# Altium footprint library ref-packages.PCBLIB: 1544 footprints (part 43 of 103)
Each footprint in its own frame and in the unit in brackets; x right, y up, seen from the top. Pads: shape width x height; smd on the part's side, far side on the other; paste and mask are expansions set on the pad; w line width, h text height; cw(c..) or ccw(c..) is an arc to the next point about the centre after c.
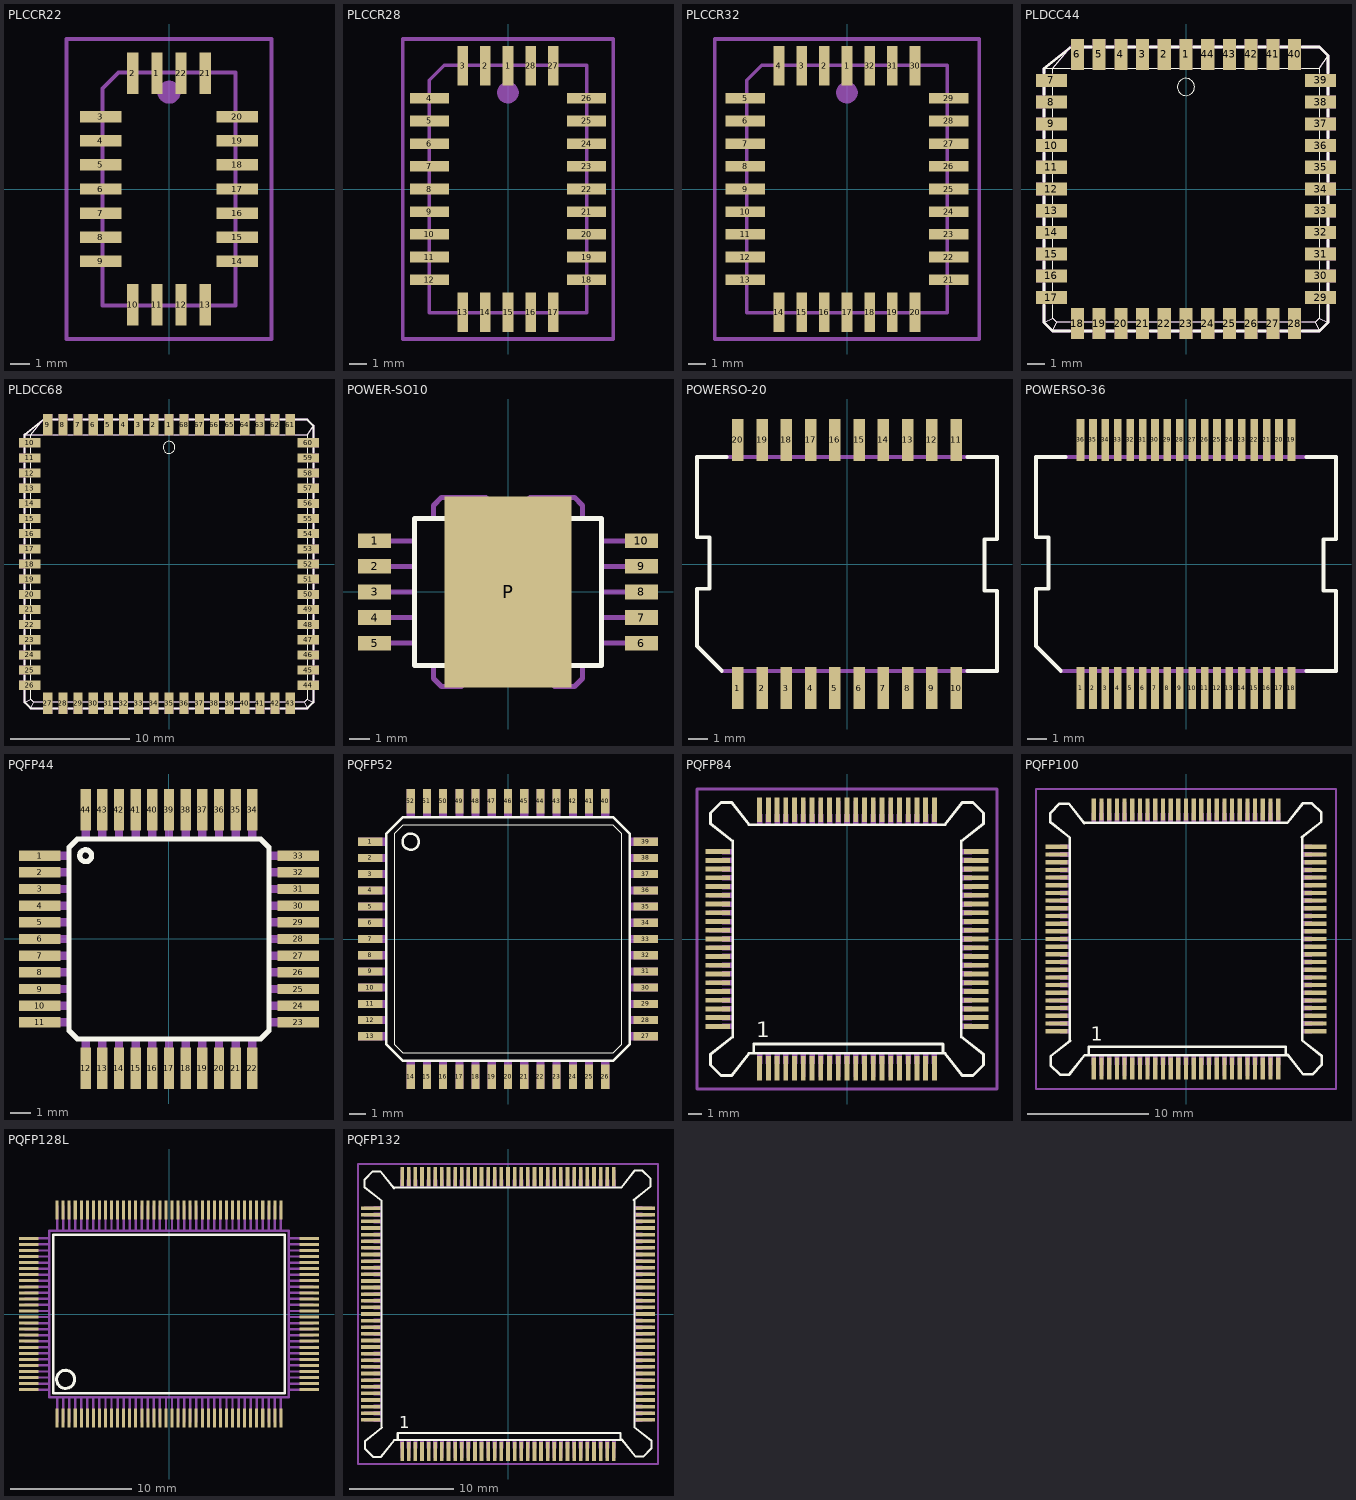
[diagram p42: the footprints below, top view; thin cyan lines are the x and y axes]

## PLCCR22 [mil]
pads (22):
  rect 23.62x86.61 smd: 1(-25,240.16) 2(-75,240.16) 10(-75,-240.16) 11(-25,-240.16) 12(25,-240.16) 13(75,-240.16) 21(75,240.16) 22(25,240.16)
  rect 86.61x23.62 smd: 3(-141.73,150) 4(-141.73,100) 5(-141.73,50) 6(-141.73,0) 7(-141.73,-50) 8(-141.73,-100) 9(-141.73,-150) 14(141.73,-150) 15(141.73,-100) 16(141.73,-50) 17(141.73,0) 18(141.73,50) 19(141.73,100) 20(141.73,150)
Mechanical 16:
  circle w24: c0,200.79 r11.81
  rectangle: -35.24,242.13 -14.37,264.96
  rectangle: -85.24,242.13 -64.37,264.96
  rectangle: -166.54,139.76 -143.7,160.63
  rectangle: -166.54,89.76 -143.7,110.63
  rectangle: -166.54,39.76 -143.7,60.63
  rectangle: -166.54,-10.24 -143.7,10.63
  rectangle: -166.54,-60.24 -143.7,-39.37
  rectangle: -166.54,-110.24 -143.7,-89.37
  rectangle: -166.54,-160.24 -143.7,-139.37
  rectangle: -85.63,-264.96 -64.76,-242.13
  rectangle: -35.63,-264.96 -14.76,-242.13
  rectangle: 14.37,-264.96 35.24,-242.13
  rectangle: 64.37,-264.96 85.24,-242.13
  rectangle: 143.7,-160.63 166.54,-139.76
  rectangle: 143.7,-110.63 166.54,-89.76
  rectangle: 143.7,-60.63 166.54,-39.76
  rectangle: 143.7,-10.63 166.54,10.24
  rectangle: 143.7,39.37 166.54,60.24
  rectangle: 143.7,89.37 166.54,110.24
  rectangle: 143.7,139.37 166.54,160.24
  rectangle: 64.76,242.13 85.63,264.96
  rectangle: 14.76,242.13 35.63,264.96
  lines w8: -138.19,-241.34 138.19,-241.34 138.19,241.34 -105.12,241.34 -138.19,208.27 -138.19,-241.34
Mechanical 27:
  lines w7.87: -212.72,-311.14 212.72,-311.14 212.72,311.14 -212.72,311.14 -212.72,-311.14

## PLCCR28 [mil]
pads (28):
  rect 23.62x86.61 smd: 1(0,271.65) 2(-50,271.65) 3(-100,271.65) 13(-100,-271.65) 14(-50,-271.65) 15(0,-271.65) 16(50,-271.65) 17(100,-271.65) 27(100,271.65) 28(50,271.65)
  rect 86.61x23.62 smd: 4(-173.23,200) 5(-173.23,150) 6(-173.23,100) 7(-173.23,50) 8(-173.23,0) 9(-173.23,-50) 10(-173.23,-100) 11(-173.23,-150) 12(-173.23,-200) 18(173.23,-200) 19(173.23,-150) 20(173.23,-100) 21(173.23,-50) 22(173.23,0) 23(173.23,50) 24(173.23,100) 25(173.23,150) 26(173.23,200)
Mechanical 16:
  circle w24: c0,212.6 r11.81
  rectangle: -10.24,273.62 10.63,296.46
  rectangle: -60.24,273.62 -39.37,296.46
  rectangle: -110.24,273.62 -89.37,296.46
  rectangle: -198.03,189.76 -175.2,210.63
  rectangle: -198.03,139.76 -175.2,160.63
  rectangle: -198.03,89.76 -175.2,110.63
  rectangle: -198.03,39.76 -175.2,60.63
  rectangle: -198.03,-10.24 -175.2,10.63
  rectangle: -198.03,-60.24 -175.2,-39.37
  rectangle: -198.03,-110.24 -175.2,-89.37
  rectangle: -198.03,-160.24 -175.2,-139.37
  rectangle: -198.03,-210.24 -175.2,-189.37
  rectangle: -110.63,-296.46 -89.76,-273.62
  rectangle: -60.63,-296.46 -39.76,-273.62
  rectangle: -10.63,-296.46 10.24,-273.62
  rectangle: 39.37,-296.46 60.24,-273.62
  rectangle: 89.37,-296.46 110.24,-273.62
  rectangle: 175.2,-210.63 198.03,-189.76
  rectangle: 175.2,-160.63 198.03,-139.76
  rectangle: 175.2,-110.63 198.03,-89.76
  rectangle: 175.2,-60.63 198.03,-39.76
  rectangle: 175.2,-10.63 198.03,10.24
  rectangle: 175.2,39.37 198.03,60.24
  rectangle: 175.2,89.37 198.03,110.24
  rectangle: 175.2,139.37 198.03,160.24
  rectangle: 175.2,189.37 198.03,210.24
  rectangle: 89.76,273.62 110.63,296.46
  rectangle: 39.76,273.62 60.63,296.46
  lines w8: -173.62,-272.83 173.62,-272.83 173.62,272.83 -140.55,272.83 -173.62,239.76 -173.62,-272.83
Mechanical 27:
  lines w7.87: -232.4,-330.83 232.4,-330.83 232.4,330.83 -232.4,330.83 -232.4,-330.83

## PLCCR32 [mm]
pads (32):
  rect 0.6x2.2 smd: 1(0,6.9) 2(-1.27,6.9) 3(-2.54,6.9) 4(-3.81,6.9) 14(-3.81,-6.9) 15(-2.54,-6.9) 16(-1.27,-6.9) 17(0,-6.9) 18(1.27,-6.9) 19(2.54,-6.9) 20(3.81,-6.9) 30(3.81,6.9) 31(2.54,6.9) 32(1.27,6.9)
  rect 2.2x0.6 smd: 5(-5.7,5.08) 6(-5.7,3.81) 7(-5.7,2.54) 8(-5.7,1.27) 9(-5.7,0) 10(-5.7,-1.27) 11(-5.7,-2.54) 12(-5.7,-3.81) 13(-5.7,-5.08) 21(5.7,-5.08) 22(5.7,-3.81) 23(5.7,-2.54) 24(5.7,-1.27) 25(5.7,0) 26(5.7,1.27) 27(5.7,2.54) 28(5.7,3.81) 29(5.7,5.08)
Mechanical 16:
  circle w0.61: c0,5.4 r0.3
  rectangle: -0.26,6.95 0.27,7.53
  rectangle: -1.53,6.95 -1,7.53
  rectangle: -2.8,6.95 -2.27,7.53
  rectangle: -4.07,6.95 -3.54,7.53
  rectangle: -6.33,4.82 -5.75,5.35
  rectangle: -6.33,3.55 -5.75,4.08
  rectangle: -6.33,2.28 -5.75,2.81
  rectangle: -6.33,1.01 -5.75,1.54
  rectangle: -6.33,-0.26 -5.75,0.27
  rectangle: -6.33,-1.53 -5.75,-1
  rectangle: -6.33,-2.8 -5.75,-2.27
  rectangle: -6.33,-4.07 -5.75,-3.54
  rectangle: -6.33,-5.34 -5.75,-4.81
  rectangle: -4.08,-7.53 -3.55,-6.95
  rectangle: -2.81,-7.53 -2.28,-6.95
  rectangle: -1.54,-7.53 -1.01,-6.95
  rectangle: -0.27,-7.53 0.26,-6.95
  rectangle: 1,-7.53 1.53,-6.95
  rectangle: 2.27,-7.53 2.8,-6.95
  rectangle: 3.54,-7.53 4.07,-6.95
  rectangle: 5.75,-5.35 6.33,-4.82
  rectangle: 5.75,-4.08 6.33,-3.55
  rectangle: 5.75,-2.81 6.33,-2.28
  rectangle: 5.75,-1.54 6.33,-1.01
  rectangle: 5.75,-0.27 6.33,0.26
  rectangle: 5.75,1 6.33,1.53
  rectangle: 5.75,2.27 6.33,2.8
  rectangle: 5.75,3.54 6.33,4.07
  rectangle: 5.75,4.81 6.33,5.34
  rectangle: 3.55,6.95 4.08,7.53
  rectangle: 2.28,6.95 2.81,7.53
  rectangle: 1.01,6.95 1.54,7.53
  lines w0.203: -5.61,-6.93 5.61,-6.93 5.61,6.93 -4.77,6.93 -5.61,6.09 -5.61,-6.93
Mechanical 27:
  lines w0.2: -7.403,-8.403 7.403,-8.403 7.403,8.403 -7.403,8.403 -7.403,-8.403

## PLDCC44 [mil]
pads (44):
  rect 29.92x70.87 smd: 1(0,309.45) 2(-50,309.45) 3(-100,309.45) 4(-150,309.45) 5(-200,309.45) 6(-250,309.45) 18(-250,-309.45) 19(-200,-309.45) 20(-150,-309.45) 21(-100,-309.45) 22(-50,-309.45) 23(0,-309.45) 24(50,-309.45) 25(100,-309.45) 26(150,-309.45) 27(200,-309.45) 28(250,-309.45) 40(250,309.45) 41(200,309.45) 42(150,309.45) 43(100,309.45) 44(50,309.45)
  rect 70.87x29.92 smd: 7(-309.45,250) 8(-309.45,200) 9(-309.45,150) 10(-309.45,100) 11(-309.45,50) 12(-309.45,0) 13(-309.45,-50) 14(-309.45,-100) 15(-309.45,-150) 16(-309.45,-200) 17(-309.45,-250) 29(309.45,-250) 30(309.45,-200) 31(309.45,-150) 32(309.45,-100) 33(309.45,-50) 34(309.45,0) 35(309.45,50) 36(309.45,100) 37(309.45,150) 38(309.45,200) 39(309.45,250)
Top Overlay:
  circle w2: c0,234.65 r19.69
  lines w2: -326.38,-306.69 -306.69,-296.85 ; -326.38,277.17 -306.69,277.17 ; -306.69,-326.38 -296.85,-306.69 ; -306.69,-265.75 -306.69,-296.85 ; -306.69,-234.25 -306.69,-215.75 ; -306.69,-184.25 -306.69,-165.75 ; -306.69,-134.25 -306.69,-115.75 ; -306.69,-84.25 -306.69,-65.75 ; -306.69,-34.25 -306.69,-15.75 ; -306.69,15.75 -306.69,34.25 ; -306.69,65.75 -306.69,84.25 ; -306.69,115.75 -306.69,134.25 ; -306.69,165.75 -306.69,184.25 ; -306.69,215.75 -306.69,234.25 ; -306.69,265.75 -306.69,277.17 ; -265.75,-306.69 -296.85,-306.69 ; -265.75,277.17 -306.69,277.17 ; -265.75,325.59 -306.69,277.17 ; -234.25,-306.69 -215.75,-306.69 ; -234.25,277.17 -215.75,277.17 ; -184.25,-306.69 -165.75,-306.69 ; -184.25,277.17 -165.75,277.17 ; -134.25,-306.69 -115.75,-306.69 ; -134.25,277.17 -115.75,277.17 ; -84.25,-306.69 -65.75,-306.69 ; -84.25,277.17 -65.75,277.17 ; -34.25,-306.69 -15.75,-306.69 ; -34.25,277.17 -15.75,277.17 ; 15.75,-306.69 34.25,-306.69 ; 15.75,277.17 34.25,277.17 ; 65.75,-306.69 84.25,-306.69 ; 65.75,277.17 84.25,277.17 ; 115.75,-306.69 134.25,-306.69 ; 115.75,277.17 134.25,277.17 ; 165.75,-306.69 184.25,-306.69 ; 165.75,277.17 184.25,277.17 ; 215.75,-306.69 234.25,-306.69 ; 215.75,277.17 234.25,277.17 ; 265.75,-306.69 296.85,-306.69 ; 265.75,277.17 306.69,277.17 ; 306.69,-326.38 296.85,-306.69 ; 306.69,-265.75 306.69,-296.85 ; 306.69,-234.25 306.69,-215.75 ; 306.69,-184.25 306.69,-165.75 ; 306.69,-134.25 306.69,-115.75 ; 306.69,-84.25 306.69,-65.75 ; 306.69,-34.25 306.69,-15.75 ; 306.69,15.75 306.69,34.25 ; 306.69,65.75 306.69,84.25 ; 306.69,115.75 306.69,134.25 ; 306.69,165.75 306.69,184.25 ; 306.69,215.75 306.69,234.25 ; 306.69,265.75 306.69,277.17 ; 326.38,-306.69 306.69,-296.85 ; 326.38,306.69 306.69,277.17 ; -306.69,-296.85 -296.85,-306.69 ; 296.85,-306.69 306.69,-296.85
  lines w6: -326.38,-267.32 -326.38,-306.69 -306.69,-326.38 -267.32,-326.38 ; -326.38,-232.68 -326.38,-217.32 ; -326.38,-182.68 -326.38,-167.32 ; -326.38,-132.68 -326.38,-117.32 ; -326.38,-82.68 -326.38,-67.32 ; -326.38,-32.68 -326.38,-17.32 ; -326.38,17.32 -326.38,32.68 ; -326.38,67.32 -326.38,82.68 ; -326.38,117.32 -326.38,132.68 ; -326.38,167.32 -326.38,182.68 ; -326.38,217.32 -326.38,232.68 ; -326.38,267.32 -326.38,277.17 -267.32,324.41 ; -232.68,-326.38 -217.32,-326.38 ; -232.68,326.38 -217.32,326.38 ; -182.68,-326.38 -167.32,-326.38 ; -182.68,326.38 -167.32,326.38 ; -132.68,-326.38 -117.32,-326.38 ; -132.68,326.38 -117.32,326.38 ; -82.68,-326.38 -67.32,-326.38 ; -82.68,326.38 -67.32,326.38 ; -32.68,-326.38 -17.32,-326.38 ; -32.68,326.38 -17.32,326.38 ; 17.32,-326.38 32.68,-326.38 ; 17.32,326.38 32.68,326.38 ; 67.32,-326.38 82.68,-326.38 ; 67.32,326.38 82.68,326.38 ; 117.32,-326.38 132.68,-326.38 ; 117.32,326.38 132.68,326.38 ; 167.32,-326.38 182.68,-326.38 ; 167.32,326.38 182.68,326.38 ; 217.32,-326.38 232.68,-326.38 ; 217.32,326.38 232.68,326.38 ; 267.32,-326.38 306.69,-326.38 326.38,-306.69 326.38,-267.32 ; 267.32,326.38 306.69,326.38 326.38,306.69 326.38,267.32 ; 326.38,-232.68 326.38,-217.32 ; 326.38,-182.68 326.38,-167.32 ; 326.38,-132.68 326.38,-117.32 ; 326.38,-82.68 326.38,-67.32 ; 326.38,-32.68 326.38,-17.32 ; 326.38,17.32 326.38,32.68 ; 326.38,67.32 326.38,82.68 ; 326.38,117.32 326.38,132.68 ; 326.38,167.32 326.38,182.68 ; 326.38,217.32 326.38,232.68
Mechanical 16:
  rectangle: 326.38,85.04 344.88,114.96
  rectangle: 326.38,35.04 344.88,64.96
  rectangle: 326.38,-14.96 344.88,14.96
  rectangle: 326.38,-64.96 344.88,-35.04
  rectangle: 326.38,-114.96 344.88,-85.04
  rectangle: 326.38,-164.96 344.88,-135.04
  rectangle: 326.38,-214.96 344.88,-185.04
  rectangle: 135.04,-344.88 164.96,-326.38
  rectangle: 85.04,-344.88 114.96,-326.38
  rectangle: 35.04,-344.88 64.96,-326.38
  rectangle: -14.96,-344.88 14.96,-326.38
  rectangle: -64.96,-344.88 -35.04,-326.38
  rectangle: -114.96,-344.88 -85.04,-326.38
  rectangle: -264.96,-344.88 -235.04,-326.38
  rectangle: -344.88,185.04 -326.38,214.96
  rectangle: -344.88,135.04 -326.38,164.96
  rectangle: -344.88,85.04 -326.38,114.96
  rectangle: -344.88,35.04 -326.38,64.96
  rectangle: -344.88,-14.96 -326.38,14.96
  rectangle: -344.88,-64.96 -326.38,-35.04
  rectangle: -344.88,-114.96 -326.38,-85.04
  rectangle: 135.04,326.38 164.96,344.88
  rectangle: 85.04,326.38 114.96,344.88
  rectangle: 35.04,326.38 64.96,344.88
  rectangle: -14.96,326.38 14.96,344.88
  rectangle: -64.96,326.38 -35.04,344.88
  rectangle: -114.96,326.38 -85.04,344.88
  rectangle: -264.96,326.38 -235.04,344.88
  rectangle: 326.38,135.04 344.88,164.96
  rectangle: 326.38,185.04 344.88,214.96
  rectangle: -344.88,-164.96 -326.38,-135.04
  rectangle: -344.88,-214.96 -326.38,-185.04
  rectangle: 185.04,326.38 214.96,344.88
  rectangle: 235.04,326.38 264.96,344.88
  rectangle: -164.96,326.38 -135.04,344.88
  rectangle: -214.96,326.38 -185.04,344.88
  rectangle: -344.88,-264.96 -326.38,-235.04
  rectangle: -214.96,-344.88 -185.04,-326.38
  rectangle: -164.96,-344.88 -135.04,-326.38
  rectangle: 185.04,-344.88 214.96,-326.38
  rectangle: 235.04,-344.88 264.96,-326.38
  rectangle: 326.38,-264.96 344.88,-235.04
  rectangle: 326.38,235.04 344.88,264.96
  rectangle: -344.88,235.04 -326.38,264.96
  lines w2: -326.38,-306.69 -306.69,-296.85 ; -326.38,277.17 -306.69,277.17 ; -306.69,-326.38 -296.85,-306.69 ; -264.96,326.38 -306.69,277.17 ; 306.69,-326.38 296.85,-306.69 ; 326.38,-306.69 306.69,-296.85 ; 326.38,306.69 306.69,277.17 ; -306.69,-296.85 -296.85,-306.69 ; -306.69,-296.85 -306.69,277.17 ; -306.69,277.17 306.69,277.17 ; -296.85,-306.69 296.85,-306.69 ; 296.85,-306.69 306.69,-296.85 ; 306.69,-296.85 306.69,277.17
  lines w6: -326.38,-306.69 -306.69,-326.38 306.69,-326.38 326.38,-306.69 326.38,306.69 306.69,326.38 -264.96,326.38 -326.38,277.17 -326.38,-306.69

## PLDCC68 [mil]
pads (68):
  rect 29.92x70.87 smd: 1(0,459.45) 2(-50,459.45) 3(-100,459.45) 4(-150,459.45) 5(-200,459.45) 6(-250,459.45) 7(-300,459.45) 8(-350,459.45) 9(-400,459.45) 27(-400,-459.45) 28(-350,-459.45) 29(-300,-459.45) 30(-250,-459.45) 31(-200,-459.45) 32(-150,-459.45) 33(-100,-459.45) 34(-50,-459.45) 35(0,-459.45) 36(50,-459.45) 37(100,-459.45) 38(150,-459.45) 39(200,-459.45) 40(250,-459.45) 41(300,-459.45) 42(350,-459.45) 43(400,-459.45) 61(400,459.45) 62(350,459.45) 63(300,459.45) 64(250,459.45) 65(200,459.45) 66(150,459.45) 67(100,459.45) 68(50,459.45)
  rect 70.87x29.92 smd: 10(-459.45,400) 11(-459.45,350) 12(-459.45,300) 13(-459.45,250) 14(-459.45,200) 15(-459.45,150) 16(-459.45,100) 17(-459.45,50) 18(-459.45,0) 19(-459.45,-50) 20(-459.45,-100) 21(-459.45,-150) 22(-459.45,-200) 23(-459.45,-250) 24(-459.45,-300) 25(-459.45,-350) 26(-459.45,-400) 44(459.45,-400) 45(459.45,-350) 46(459.45,-300) 47(459.45,-250) 48(459.45,-200) 49(459.45,-150) 50(459.45,-100) 51(459.45,-50) 52(459.45,0) 53(459.45,50) 54(459.45,100) 55(459.45,150) 56(459.45,200) 57(459.45,250) 58(459.45,300) 59(459.45,350) 60(459.45,400)
Top Overlay:
  drawing of 157 lines, arcs and shapes, not listed
Mechanical 16:
  rectangle: 476.38,85.04 494.88,114.96
  rectangle: 476.38,35.04 494.88,64.96
  rectangle: 476.38,-14.96 494.88,14.96
  rectangle: 476.38,-64.96 494.88,-35.04
  rectangle: 476.38,-114.96 494.88,-85.04
  rectangle: 476.38,-164.96 494.88,-135.04
  rectangle: 476.38,-214.96 494.88,-185.04
  rectangle: 135.04,-494.88 164.96,-476.38
  rectangle: 85.04,-494.88 114.96,-476.38
  rectangle: 35.04,-494.88 64.96,-476.38
  rectangle: -14.96,-494.88 14.96,-476.38
  rectangle: -64.96,-494.88 -35.04,-476.38
  rectangle: -114.96,-494.88 -85.04,-476.38
  rectangle: -414.96,-494.88 -385.04,-476.38
  rectangle: -494.88,185.04 -476.38,214.96
  rectangle: -494.88,135.04 -476.38,164.96
  rectangle: -494.88,85.04 -476.38,114.96
  rectangle: -494.88,35.04 -476.38,64.96
  rectangle: -494.88,-14.96 -476.38,14.96
  rectangle: -494.88,-64.96 -476.38,-35.04
  rectangle: -494.88,-114.96 -476.38,-85.04
  rectangle: 135.04,476.38 164.96,494.88
  rectangle: 85.04,476.38 114.96,494.88
  rectangle: 35.04,476.38 64.96,494.88
  rectangle: -14.96,476.38 14.96,494.88
  rectangle: -64.96,476.38 -35.04,494.88
  rectangle: -114.96,476.38 -85.04,494.88
  rectangle: -414.96,476.38 -385.04,494.88
  rectangle: 476.38,135.04 494.88,164.96
  rectangle: 476.38,185.04 494.88,214.96
  rectangle: -494.88,-164.96 -476.38,-135.04
  rectangle: -494.88,-214.96 -476.38,-185.04
  rectangle: 185.04,476.38 214.96,494.88
  rectangle: 235.04,476.38 264.96,494.88
  rectangle: -164.96,476.38 -135.04,494.88
  rectangle: -214.96,476.38 -185.04,494.88
  rectangle: -494.88,-264.96 -476.38,-235.04
  rectangle: -214.96,-494.88 -185.04,-476.38
  rectangle: -164.96,-494.88 -135.04,-476.38
  rectangle: 185.04,-494.88 214.96,-476.38
  rectangle: 235.04,-494.88 264.96,-476.38
  rectangle: 476.38,-264.96 494.88,-235.04
  rectangle: 476.38,235.04 494.88,264.96
  rectangle: -494.88,235.04 -476.38,264.96
  rectangle: -264.96,-494.88 -235.04,-476.38
  rectangle: -314.96,-494.88 -285.04,-476.38
  rectangle: -364.96,-494.88 -335.04,-476.38
  rectangle: -494.88,-314.96 -476.38,-285.04
  rectangle: -494.88,-364.96 -476.38,-335.04
  rectangle: -494.88,-414.96 -476.38,-385.04
  rectangle: -494.88,285.04 -476.38,314.96
  rectangle: -494.88,335.04 -476.38,364.96
  rectangle: -494.88,385.04 -476.38,414.96
  rectangle: -264.96,476.38 -235.04,494.88
  rectangle: -314.96,476.38 -285.04,494.88
  rectangle: -364.96,476.38 -335.04,494.88
  rectangle: 476.38,285.04 494.88,314.96
  rectangle: 476.38,335.04 494.88,364.96
  rectangle: 476.38,385.04 494.88,414.96
  rectangle: 285.04,476.38 314.96,494.88
  rectangle: 335.04,476.38 364.96,494.88
  rectangle: 385.04,476.38 414.96,494.88
  rectangle: 476.38,-314.96 494.88,-285.04
  rectangle: 476.38,-364.96 494.88,-335.04
  rectangle: 476.38,-414.96 494.88,-385.04
  rectangle: 285.04,-494.88 314.96,-476.38
  rectangle: 335.04,-494.88 364.96,-476.38
  rectangle: 385.04,-494.88 414.96,-476.38
  lines w2: -476.38,-456.69 -456.69,-446.85 ; -476.38,427.17 -456.69,427.17 ; -456.69,-476.38 -446.85,-456.69 ; -414.96,476.38 -456.69,427.17 ; 456.69,-476.38 446.85,-456.69 ; 476.38,-456.69 456.69,-446.85 ; 476.38,456.69 456.69,427.17 ; -456.69,-446.85 -446.85,-456.69 ; -456.69,-446.85 -456.69,427.17 ; -456.69,427.17 456.69,427.17 ; -446.85,-456.69 446.85,-456.69 ; 446.85,-456.69 456.69,-446.85 ; 456.69,-446.85 456.69,427.17
  lines w6: -476.38,-456.69 -456.69,-476.38 456.69,-476.38 476.38,-456.69 476.38,456.69 456.69,476.38 -414.96,476.38 -476.38,427.17 -476.38,-456.69

## POWER-SO10 [mm]
pads (11):
  rect 1.65x0.73 smd: 1(-6.625,2.54) 2(-6.625,1.27) 3(-6.625,0) 4(-6.625,-1.27) 5(-6.625,-2.54) 6(6.625,-2.54) 7(6.625,-1.27) 8(6.625,0) 9(6.625,1.27) 10(6.625,2.54)
  rect 6.3x9.5 smd: P(0,0)
Top Overlay:
  lines w0.254: -1,3.6 ccw(c0,3.6) 1,3.6 ; -4.65,-3.65 4.65,-3.65 4.65,3.65 -4.65,3.65 -4.65,-3.65
Mechanical 16:
  rectangle: -7.175,2.413 -4.635,2.667
  rectangle: -7.175,1.143 -4.635,1.397
  rectangle: -7.175,-0.127 -4.635,0.127
  rectangle: -7.175,-1.397 -4.635,-1.143
  rectangle: -7.175,-2.667 -4.635,-2.413
  rectangle: 4.635,-2.667 7.175,-2.413
  rectangle: 4.635,-1.397 7.175,-1.143
  rectangle: 4.635,-0.127 7.175,0.127
  rectangle: 4.635,1.143 7.175,1.397
  rectangle: 4.635,2.413 7.175,2.667
  lines w0.254: -3.7,-3.8 -3.7,-4.3 -3.3,-4.7 -2.3,-4.7 -2.3,-4.5 -2.1,-4.3 2.1,-4.3 2.3,-4.5 2.3,-4.7 3.3,-4.7 3.7,-4.3 3.7,-3.8 ; -3.7,3.8 -3.7,4.3 -3.3,4.7 -1.1,4.7 ccw(c0,5.9) 1.1,4.7 3.3,4.7 3.7,4.3 3.7,3.8

## POWERSO-20 [mil]
pads (20):
  rect 23.62x86.61 smd: 1(-225,-255.91) 2(-175,-255.91) 3(-125,-255.91) 4(-75,-255.91) 5(-25,-255.91) 6(25,-255.91) 7(75,-255.91) 8(125,-255.91) 9(175,-255.91) 10(225,-255.91) 11(225,255.91) 12(175,255.91) 13(125,255.91) 14(75,255.91) 15(25,255.91) 16(-25,255.91) 17(-75,255.91) 18(-125,255.91) 19(-175,255.91) 20(-225,255.91)
Top Overlay:
  lines w8: -309.45,220.47 -309.45,55.12 -283.46,55.12 -283.46,-51.18 -309.45,-51.18 -309.45,-169.29 -258.27,-220.47 ; -307.09,220.47 -248.03,220.47 ; 248.03,-220.47 307.09,-220.47 ; 248.03,220.47 307.09,220.47 ; 309.45,-220.47 309.45,-55.12 283.46,-55.12 283.46,51.18 309.45,51.18 309.45,220.47
Mechanical 16:
  rectangle: -234.65,-284.25 -215.35,-224.41
  rectangle: -184.65,-284.25 -165.35,-224.41
  rectangle: -134.65,-284.25 -115.35,-224.41
  rectangle: -84.65,-284.25 -65.35,-224.41
  rectangle: -34.65,-284.25 -15.35,-224.41
  rectangle: 15.35,-284.25 34.65,-224.41
  rectangle: 65.35,-284.25 84.65,-224.41
  rectangle: 115.35,-284.25 134.65,-224.41
  rectangle: 165.35,-284.25 184.65,-224.41
  rectangle: 215.35,-284.25 234.65,-224.41
  rectangle: 215.35,224.41 234.65,284.25
  rectangle: 165.35,224.41 184.65,284.25
  rectangle: 115.35,224.41 134.65,284.25
  rectangle: 65.35,224.41 84.65,284.25
  rectangle: 15.35,224.41 34.65,284.25
  rectangle: -34.65,224.41 -15.35,284.25
  rectangle: -84.65,224.41 -65.35,284.25
  rectangle: -134.65,224.41 -115.35,284.25
  rectangle: -184.65,224.41 -165.35,284.25
  rectangle: -234.65,224.41 -215.35,284.25
  lines w8: -309.45,220.47 309.45,220.47 ; -258.27,-220.47 309.45,-220.47

## POWERSO-36 [mm]
pads (36):
  rect 0.4x2.2 smd: 1(-5.525,-6.5) 2(-4.875,-6.5) 3(-4.225,-6.5) 4(-3.575,-6.5) 5(-2.925,-6.5) 6(-2.275,-6.5) 7(-1.625,-6.5) 8(-0.975,-6.5) 9(-0.325,-6.5) 10(0.325,-6.5) 11(0.975,-6.5) 12(1.625,-6.5) 13(2.275,-6.5) 14(2.925,-6.5) 15(3.575,-6.5) 16(4.225,-6.5) 17(4.875,-6.5) 18(5.525,-6.5) 19(5.525,6.5) 20(4.875,6.5) 21(4.225,6.5) 22(3.575,6.5) 23(2.925,6.5) 24(2.275,6.5) 25(1.625,6.5) 26(0.975,6.5) 27(0.325,6.5) 28(-0.325,6.5) 29(-0.975,6.5) 30(-1.625,6.5) 31(-2.275,6.5) 32(-2.925,6.5) 33(-3.575,6.5) 34(-4.225,6.5) 35(-4.875,6.5) 36(-5.525,6.5)
Top Overlay:
  lines w0.203: -7.86,5.6 -7.86,1.4 -7.2,1.4 -7.2,-1.3 -7.86,-1.3 -7.86,-4.3 -6.56,-5.6 ; -7.8,5.6 -6.3,5.6 ; 6.3,-5.6 7.8,-5.6 ; 6.3,5.6 7.8,5.6 ; 7.86,-5.6 7.86,-1.4 7.2,-1.4 7.2,1.3 7.86,1.3 7.86,5.6
Mechanical 16:
  rectangle: -5.7,-7.225 -5.35,-5.675
  rectangle: -5.05,-7.225 -4.7,-5.675
  rectangle: -4.4,-7.225 -4.05,-5.675
  rectangle: -3.75,-7.225 -3.4,-5.675
  rectangle: -3.1,-7.225 -2.75,-5.675
  rectangle: -2.45,-7.225 -2.1,-5.675
  rectangle: -1.8,-7.225 -1.45,-5.675
  rectangle: -1.15,-7.225 -0.8,-5.675
  rectangle: -0.5,-7.225 -0.15,-5.675
  rectangle: 0.15,-7.225 0.5,-5.675
  rectangle: 0.8,-7.225 1.15,-5.675
  rectangle: 1.45,-7.225 1.8,-5.675
  rectangle: 2.1,-7.225 2.45,-5.675
  rectangle: 2.75,-7.225 3.1,-5.675
  rectangle: 3.4,-7.225 3.75,-5.675
  rectangle: 4.05,-7.225 4.4,-5.675
  rectangle: 4.7,-7.225 5.05,-5.675
  rectangle: 5.35,-7.225 5.7,-5.675
  rectangle: 5.35,5.675 5.7,7.225
  rectangle: 4.7,5.675 5.05,7.225
  rectangle: 4.05,5.675 4.4,7.225
  rectangle: 3.4,5.675 3.75,7.225
  rectangle: 2.75,5.675 3.1,7.225
  rectangle: 2.1,5.675 2.45,7.225
  rectangle: 1.45,5.675 1.8,7.225
  rectangle: 0.8,5.675 1.15,7.225
  rectangle: 0.15,5.675 0.5,7.225
  rectangle: -0.5,5.675 -0.15,7.225
  rectangle: -1.15,5.675 -0.8,7.225
  rectangle: -1.8,5.675 -1.45,7.225
  rectangle: -2.45,5.675 -2.1,7.225
  rectangle: -3.1,5.675 -2.75,7.225
  rectangle: -3.75,5.675 -3.4,7.225
  rectangle: -4.4,5.675 -4.05,7.225
  rectangle: -5.05,5.675 -4.7,7.225
  rectangle: -5.7,5.675 -5.35,7.225
  lines w0.203: -7.86,5.6 7.86,5.6 ; -6.56,-5.6 7.86,-5.6

## PQFP44 [mm]
pads (44):
  rect 2x0.5 smd: 1(-6.2,4) 2(-6.2,3.2) 3(-6.2,2.4) 4(-6.2,1.6) 5(-6.2,0.8) 6(-6.2,0) 7(-6.2,-0.8) 8(-6.2,-1.6) 9(-6.2,-2.4) 10(-6.2,-3.2) 11(-6.2,-4) 23(6.2,-4) 24(6.2,-3.2) 25(6.2,-2.4) 26(6.2,-1.6) 27(6.2,-0.8) 28(6.2,0) 29(6.2,0.8) 30(6.2,1.6) 31(6.2,2.4) 32(6.2,3.2) 33(6.2,4)
  rect 0.5x2 smd: 12(-4,-6.2) 13(-3.2,-6.2) 14(-2.4,-6.2) 15(-1.6,-6.2) 16(-0.8,-6.2) 17(0,-6.2) 18(0.8,-6.2) 19(1.6,-6.2) 20(2.4,-6.2) 21(3.2,-6.2) 22(4,-6.2) 34(4,6.2) 35(3.2,6.2) 36(2.4,6.2) 37(1.6,6.2) 38(0.8,6.2) 39(0,6.2) 40(-0.8,6.2) 41(-1.6,6.2) 42(-2.4,6.2) 43(-3.2,6.2) 44(-4,6.2)
Top Overlay:
  circle w0.254: c-4,4 r0.283
  lines w0.254: -4.8,-4.4 -4.4,-4.8 4.4,-4.8 4.8,-4.4 4.8,4.4 4.4,4.8 -4.4,4.8 -4.8,4.4 -4.8,-4.4
Mechanical 16:
  rectangle: -6.7,3.8 -4.9,4.2
  rectangle: -6.7,3 -4.9,3.4
  rectangle: -6.7,2.2 -4.9,2.6
  rectangle: -6.7,1.4 -4.9,1.8
  rectangle: -6.7,0.6 -4.9,1
  rectangle: -6.7,-0.2 -4.9,0.2
  rectangle: -6.7,-1 -4.9,-0.6
  rectangle: -6.7,-1.8 -4.9,-1.4
  rectangle: -6.7,-2.6 -4.9,-2.2
  rectangle: -6.7,-3.4 -4.9,-3
  rectangle: -6.7,-4.2 -4.9,-3.8
  rectangle: -4.2,-6.7 -3.8,-4.9
  rectangle: -3.4,-6.7 -3,-4.9
  rectangle: -2.6,-6.7 -2.2,-4.9
  rectangle: -1.8,-6.7 -1.4,-4.9
  rectangle: -1,-6.7 -0.6,-4.9
  rectangle: -0.2,-6.7 0.2,-4.9
  rectangle: 0.6,-6.7 1,-4.9
  rectangle: 1.4,-6.7 1.8,-4.9
  rectangle: 2.2,-6.7 2.6,-4.9
  rectangle: 3,-6.7 3.4,-4.9
  rectangle: 3.8,-6.7 4.2,-4.9
  rectangle: 4.9,-4.2 6.7,-3.8
  rectangle: 4.9,-3.4 6.7,-3
  rectangle: 4.9,-2.6 6.7,-2.2
  rectangle: 4.9,-1.8 6.7,-1.4
  rectangle: 4.9,-1 6.7,-0.6
  rectangle: 4.9,-0.2 6.7,0.2
  rectangle: 4.9,0.6 6.7,1
  rectangle: 4.9,1.4 6.7,1.8
  rectangle: 4.9,2.2 6.7,2.6
  rectangle: 4.9,3 6.7,3.4
  rectangle: 4.9,3.8 6.7,4.2
  rectangle: 3.8,4.9 4.2,6.7
  rectangle: 3,4.9 3.4,6.7
  rectangle: 2.2,4.9 2.6,6.7
  rectangle: 1.4,4.9 1.8,6.7
  rectangle: 0.6,4.9 1,6.7
  rectangle: -0.2,4.9 0.2,6.7
  rectangle: -1,4.9 -0.6,6.7
  rectangle: -1.8,4.9 -1.4,6.7
  rectangle: -2.6,4.9 -2.2,6.7
  rectangle: -3.4,4.9 -3,6.7
  rectangle: -4.2,4.9 -3.8,6.7
  text "PQFP-44" at -2.785,-3.985 h0.94

## PQFP52 [mm]
pads (52):
  rect 1.5x0.5 smd: 1(-8.5,6) 2(-8.5,5) 3(-8.5,4) 4(-8.5,3) 5(-8.5,2) 6(-8.5,1) 7(-8.5,0) 8(-8.5,-1) 9(-8.5,-2) 10(-8.5,-3) 11(-8.5,-4) 12(-8.5,-5) 13(-8.5,-6) 27(8.5,-6) 28(8.5,-5) 29(8.5,-4) 30(8.5,-3) 31(8.5,-2) 32(8.5,-1) 33(8.5,0) 34(8.5,1) 35(8.5,2) 36(8.5,3) 37(8.5,4) 38(8.5,5) 39(8.5,6)
  rect 0.5x1.5 smd: 14(-6,-8.5) 15(-5,-8.5) 16(-4,-8.5) 17(-3,-8.5) 18(-2,-8.5) 19(-1,-8.5) 20(0,-8.5) 21(1,-8.5) 22(2,-8.5) 23(3,-8.5) 24(4,-8.5) 25(5,-8.5) 26(6,-8.5) 40(6,8.5) 41(5,8.5) 42(4,8.5) 43(3,8.5) 44(2,8.5) 45(1,8.5) 46(0,8.5) 47(-1,8.5) 48(-2,8.5) 49(-3,8.5) 50(-4,8.5) 51(-5,8.5) 52(-6,8.5)
Top Overlay:
  circle w0.152: c-6,6 r0.5
  lines w0.051: -7,-6.5 -7,6.5 -6.5,7 6.5,7 7,6.5 7,-6.5 6.5,-7 -6.5,-7 -7,-6.5
  lines w0.152: -7.5,-6.5 -7.5,6.5 -6.5,7.5 6.5,7.5 7.5,6.5 7.5,-6.5 6.5,-7.5 -6.5,-7.5 -7.5,-6.5
Mechanical 16:
  rectangle: -9.25,5.75 -7.5,6.25
  rectangle: -9.25,4.75 -7.5,5.25
  rectangle: -9.25,3.75 -7.5,4.25
  rectangle: -9.25,2.75 -7.5,3.25
  rectangle: -9.25,1.75 -7.5,2.25
  rectangle: -9.25,0.75 -7.5,1.25
  rectangle: -9.25,-0.25 -7.5,0.25
  rectangle: -9.25,-1.25 -7.5,-0.75
  rectangle: -9.25,-2.25 -7.5,-1.75
  rectangle: -9.25,-3.25 -7.5,-2.75
  rectangle: -9.25,-4.25 -7.5,-3.75
  rectangle: -9.25,-5.25 -7.5,-4.75
  rectangle: -6.25,-9.25 -5.75,-7.5
  rectangle: -5.25,-9.25 -4.75,-7.5
  rectangle: -4.25,-9.25 -3.75,-7.5
  rectangle: -3.25,-9.25 -2.75,-7.5
  rectangle: -2.25,-9.25 -1.75,-7.5
  rectangle: -1.25,-9.25 -0.75,-7.5
  rectangle: -0.25,-9.25 0.25,-7.5
  rectangle: 0.75,-9.25 1.25,-7.5
  rectangle: 1.75,-9.25 2.25,-7.5
  rectangle: 2.75,-9.25 3.25,-7.5
  rectangle: 3.75,-9.25 4.25,-7.5
  rectangle: 4.75,-9.25 5.25,-7.5
  rectangle: 5.75,-9.25 6.25,-7.5
  rectangle: 7.5,-6.25 9.25,-5.75
  rectangle: 7.5,-5.25 9.25,-4.75
  rectangle: 7.5,-4.25 9.25,-3.75
  rectangle: 7.5,-3.25 9.25,-2.75
  rectangle: 7.5,-2.25 9.25,-1.75
  rectangle: 7.5,-1.25 9.25,-0.75
  rectangle: 7.5,-0.25 9.25,0.25
  rectangle: 7.5,0.75 9.25,1.25
  rectangle: 7.5,1.75 9.25,2.25
  rectangle: 7.5,2.75 9.25,3.25
  rectangle: 7.5,3.75 9.25,4.25
  rectangle: 7.5,4.75 9.25,5.25
  rectangle: 7.5,5.75 9.25,6.25
  rectangle: 4.75,7.5 5.25,9.25
  rectangle: 5.75,7.5 6.25,9.25
  rectangle: -1.25,7.5 -0.75,9.25
  rectangle: -0.25,7.5 0.25,9.25
  rectangle: 0.75,7.5 1.25,9.25
  rectangle: 1.75,7.5 2.25,9.25
  rectangle: 2.75,7.5 3.25,9.25
  rectangle: 3.75,7.5 4.25,9.25
  rectangle: -2.25,7.5 -1.75,9.25
  rectangle: -3.25,7.5 -2.75,9.25
  rectangle: -4.25,7.5 -3.75,9.25
  rectangle: -5.25,7.5 -4.75,9.25
  rectangle: -6.25,7.5 -5.75,9.25
  rectangle: -9.25,-6.25 -7.5,-5.75

## PQFP84 [mm]
pads (84):
  rect 0.35x1.8 smd: 1(-6.35,-9.4) 2(-5.715,-9.4) 3(-5.08,-9.4) 4(-4.445,-9.4) 5(-3.81,-9.4) 6(-3.175,-9.4) 7(-2.54,-9.4) 8(-1.905,-9.4) 9(-1.27,-9.4) 10(-0.635,-9.4) 11(0,-9.4) 12(0.635,-9.4) 13(1.27,-9.4) 14(1.905,-9.4) 15(2.54,-9.4) 16(3.175,-9.4) 17(3.81,-9.4) 18(4.445,-9.4) 19(5.08,-9.4) 20(5.715,-9.4) 21(6.35,-9.4) 43(6.35,9.4) 44(5.715,9.4) 45(5.08,9.4) 46(4.445,9.4) 47(3.81,9.4) 48(3.175,9.4) 49(2.54,9.4) 50(1.905,9.4) 51(1.27,9.4) 52(0.635,9.4) 53(0,9.4) 54(-0.635,9.4) 55(-1.27,9.4) 56(-1.905,9.4) 57(-2.54,9.4) 58(-3.175,9.4) 59(-3.81,9.4) 60(-4.445,9.4) 61(-5.08,9.4) 62(-5.715,9.4) 63(-6.35,9.4)
  rect 1.8x0.35 smd: 22(9.4,-6.35) 23(9.4,-5.715) 24(9.4,-5.08) 25(9.4,-4.445) 26(9.4,-3.81) 27(9.4,-3.175) 28(9.4,-2.54) 29(9.4,-1.905) 30(9.4,-1.27) 31(9.4,-0.635) 32(9.4,0) 33(9.4,0.635) 34(9.4,1.27) 35(9.4,1.905) 36(9.4,2.54) 37(9.4,3.175) 38(9.4,3.81) 39(9.4,4.445) 40(9.4,5.08) 41(9.4,5.715) 42(9.4,6.35) 64(-9.4,6.35) 65(-9.4,5.715) 66(-9.4,5.08) 67(-9.4,4.445) 68(-9.4,3.81) 69(-9.4,3.175) 70(-9.4,2.54) 71(-9.4,1.905) 72(-9.4,1.27) 73(-9.4,0.635) 74(-9.4,0) 75(-9.4,-0.635) 76(-9.4,-1.27) 77(-9.4,-1.905) 78(-9.4,-2.54) 79(-9.4,-3.175) 80(-9.4,-3.81) 81(-9.4,-4.445) 82(-9.4,-5.08) 83(-9.4,-5.715) 84(-9.4,-6.35)
Top Overlay:
  lines w0.203: -9.92,-8.382 -9.92,-9.144 -9.144,-9.906 ; -9.92,8.382 -9.92,9.144 ; -9.906,-8.382 -8.3,-7.112 -8.3,7.112 -9.906,8.382 ; -9.906,9.144 -9.144,9.92 -8.382,9.92 ; -9.144,-9.92 -8.382,-9.92 ; -8.382,-9.906 -7.112,-8.3 -6.776,-8.3 ; -8.382,9.906 -7.112,8.3 7.112,8.3 8.382,9.906 ; 6.985,-8.255 6.985,-7.62 -6.776,-7.62 -6.776,-8.3 ; 8.382,-9.92 9.144,-9.92 9.906,-9.144 ; 8.382,-9.906 7.112,-8.3 -6.776,-8.3 ; 8.382,9.92 9.144,9.92 ; 9.144,9.906 9.92,9.144 9.92,8.382 ; 9.906,-8.382 8.3,-7.112 8.3,7.112 9.906,8.382 ; 9.92,-9.144 9.92,-8.382
  text "1" at -6.61,-7.53 h1.97
Mechanical 16:
  drawing of 168 lines, arcs and shapes, not listed
Mechanical 27:
  lines w0.2: -10.9,-10.9 -10.9,10.9 10.9,10.9 10.9,-10.9 -10.9,-10.9

## PQFP100 [mm]
pads (100):
  rect 0.35x1.8 smd: 1(-7.62,-10.7) 2(-6.985,-10.7) 3(-6.35,-10.7) 4(-5.715,-10.7) 5(-5.08,-10.7) 6(-4.445,-10.7) 7(-3.81,-10.7) 8(-3.175,-10.7) 9(-2.54,-10.7) 10(-1.905,-10.7) 11(-1.27,-10.7) 12(-0.635,-10.7) 13(0,-10.7) 14(0.635,-10.7) 15(1.27,-10.7) 16(1.905,-10.7) 17(2.54,-10.7) 18(3.175,-10.7) 19(3.81,-10.7) 20(4.445,-10.7) 21(5.08,-10.7) 22(5.715,-10.7) 23(6.35,-10.7) 24(6.985,-10.7) 25(7.62,-10.7) 51(7.62,10.7) 52(6.985,10.7) 53(6.35,10.7) 54(5.715,10.7) 55(5.08,10.7) 56(4.445,10.7) 57(3.81,10.7) 58(3.175,10.7) 59(2.54,10.7) 60(1.905,10.7) 61(1.27,10.7) 62(0.635,10.7) 63(0,10.7) 64(-0.635,10.7) 65(-1.27,10.7) 66(-1.905,10.7) 67(-2.54,10.7) 68(-3.175,10.7) 69(-3.81,10.7) 70(-4.445,10.7) 71(-5.08,10.7) 72(-5.715,10.7) 73(-6.35,10.7) 74(-6.985,10.7) 75(-7.62,10.7)
  rect 1.8x0.35 smd: 26(10.7,-7.62) 27(10.7,-6.985) 28(10.7,-6.35) 29(10.7,-5.715) 30(10.7,-5.08) 31(10.7,-4.445) 32(10.7,-3.81) 33(10.7,-3.175) 34(10.7,-2.54) 35(10.7,-1.905) 36(10.7,-1.27) 37(10.7,-0.635) 38(10.7,0) 39(10.7,0.635) 40(10.7,1.27) 41(10.7,1.905) 42(10.7,2.54) 43(10.7,3.175) 44(10.7,3.81) 45(10.7,4.445) 46(10.7,5.08) 47(10.7,5.715) 48(10.7,6.35) 49(10.7,6.985) 50(10.7,7.62) 76(-10.7,7.62) 77(-10.7,6.985) 78(-10.7,6.35) 79(-10.7,5.715) 80(-10.7,5.08) 81(-10.7,4.445) 82(-10.7,3.81) 83(-10.7,3.175) 84(-10.7,2.54) 85(-10.7,1.905) 86(-10.7,1.27) 87(-10.7,0.635) 88(-10.7,0) 89(-10.7,-0.635) 90(-10.7,-1.27) 91(-10.7,-1.905) 92(-10.7,-2.54) 93(-10.7,-3.175) 94(-10.7,-3.81) 95(-10.7,-4.445) 96(-10.7,-5.08) 97(-10.7,-5.715) 98(-10.7,-6.35) 99(-10.7,-6.985) 100(-10.7,-7.62)
Top Overlay:
  lines w0.203: -11.22,9.652 -11.22,10.414 ; -11.206,9.652 -9.6,8.382 ; -11.206,10.414 -10.444,11.19 -9.682,11.19 ; -11.19,-9.682 -11.19,-10.444 -10.414,-11.206 ; -11.176,-9.682 -9.57,-8.412 ; -10.414,-11.22 -9.652,-11.22 ; -9.682,11.176 -8.412,9.57 ; -9.652,-11.206 -8.382,-9.6 -8.046,-9.6 ; -9.6,-8.382 -9.6,8.3 ; -8.382,9.6 8.3,9.6 ; 8.255,-9.555 8.255,-8.92 -8.046,-8.92 -8.046,-9.6 ; 8.382,-9.6 -8.046,-9.6 ; 8.382,9.6 9.652,11.206 ; 8.412,-9.57 9.682,-11.176 ; 9.57,8.412 11.176,9.682 ; 9.6,-8.382 11.206,-9.652 ; 9.6,-8.3 9.6,8.382 ; 9.652,11.22 10.414,11.22 ; 9.682,-11.19 10.444,-11.19 11.206,-10.414 ; 10.414,11.206 11.19,10.444 11.19,9.682 ; 11.22,-10.414 11.22,-9.652
  text "1" at -7.88,-8.83 h1.97
Mechanical 16:
  drawing of 200 lines, arcs and shapes, not listed
Mechanical 27:
  lines w0.2: -12.4,-12.4 -12.4,12.4 12.4,12.4 12.4,-12.4 -12.4,-12.4

## PQFP128L [mil]
pads (128):
  rect 9.84x62.99 smd: 1(-364.17,-338.58) 2(-344.49,-338.58) 3(-324.8,-338.58) 4(-305.12,-338.58) 5(-285.43,-338.58) 6(-265.75,-338.58) 7(-246.06,-338.58) 8(-226.38,-338.58) 9(-206.69,-338.58) 10(-187.01,-338.58) 11(-167.32,-338.58) 12(-147.64,-338.58) 13(-127.95,-338.58) 14(-108.27,-338.58) 15(-88.58,-338.58) 16(-68.9,-338.58) 17(-49.21,-338.58) 18(-29.53,-338.58) 19(-9.84,-338.58) 20(9.84,-338.58) 21(29.53,-338.58) 22(49.21,-338.58) 23(68.9,-338.58) 24(88.58,-338.58) 25(108.27,-338.58) 26(127.95,-338.58) 27(147.64,-338.58) 28(167.32,-338.58) 29(187.01,-338.58) 30(206.69,-338.58) 31(226.38,-338.58) 32(246.06,-338.58) 33(265.75,-338.58) 34(285.43,-338.58) 35(305.12,-338.58) 36(324.8,-338.58) 37(344.49,-338.58) 38(364.17,-338.58) 65(364.17,338.58) 66(344.49,338.58) 67(324.8,338.58) 68(305.12,338.58) 69(285.43,338.58) 70(265.75,338.58) 71(246.06,338.58) 72(226.38,338.58) 73(206.69,338.58) 74(187.01,338.58) 75(167.32,338.58) 76(147.64,338.58) 77(127.95,338.58) 78(108.27,338.58) 79(88.58,338.58) 80(68.9,338.58) 81(49.21,338.58) 82(29.53,338.58) 83(9.84,338.58) 84(-9.84,338.58) 85(-29.53,338.58) 86(-49.21,338.58) 87(-68.9,338.58) 88(-88.58,338.58) 89(-108.27,338.58) 90(-127.95,338.58) 91(-147.64,338.58) 92(-167.32,338.58) 93(-187.01,338.58) 94(-206.69,338.58) 95(-226.38,338.58) 96(-246.06,338.58) 97(-265.75,338.58) 98(-285.43,338.58) 99(-305.12,338.58) 100(-324.8,338.58) 101(-344.49,338.58) 102(-364.17,338.58)
  rect 62.99x9.84 smd: 39(456.69,-246.06) 40(456.69,-226.38) 41(456.69,-206.69) 42(456.69,-187.01) 43(456.69,-167.32) 44(456.69,-147.64) 45(456.69,-127.95) 46(456.69,-108.27) 47(456.69,-88.58) 48(456.69,-68.9) 49(456.69,-49.21) 50(456.69,-29.53) 51(456.69,-9.84) 52(456.69,9.84) 53(456.69,29.53) 54(456.69,49.21) 55(456.69,68.9) 56(456.69,88.58) 57(456.69,108.27) 58(456.69,127.95) 59(456.69,147.64) 60(456.69,167.32) 61(456.69,187.01) 62(456.69,206.69) 63(456.69,226.38) 64(456.69,246.06) 103(-456.69,246.06) 104(-456.69,226.38) 105(-456.69,206.69) 106(-456.69,187.01) 107(-456.69,167.32) 108(-456.69,147.64) 109(-456.69,127.95) 110(-456.69,108.27) 111(-456.69,88.58) 112(-456.69,68.9) 113(-456.69,49.21) 114(-456.69,29.53) 115(-456.69,9.84) 116(-456.69,-9.84) 117(-456.69,-29.53) 118(-456.69,-49.21) 119(-456.69,-68.9) 120(-456.69,-88.58) 121(-456.69,-108.27) 122(-456.69,-127.95) 123(-456.69,-147.64) 124(-456.69,-167.32) 125(-456.69,-187.01) 126(-456.69,-206.69) 127(-456.69,-226.38) 128(-456.69,-246.06)
Top Overlay:
  circle w10: c-336.61,-212.6 r29.52
  lines w8: -376.77,-258.27 376.38,-258.27 376.38,258.27 -376.77,258.27 -376.77,-258.27
Mechanical 16:
  rectangle: -368.11,-352.36 -360.24,-273.62
  rectangle: -348.43,-352.36 -340.55,-273.62
  rectangle: -328.74,-352.36 -320.87,-273.62
  rectangle: -309.06,-352.36 -301.18,-273.62
  rectangle: -289.37,-352.36 -281.5,-273.62
  rectangle: -269.69,-352.36 -261.81,-273.62
  rectangle: -250,-352.36 -242.13,-273.62
  rectangle: -230.32,-352.36 -222.44,-273.62
  rectangle: -210.63,-352.36 -202.76,-273.62
  rectangle: -190.94,-352.36 -183.07,-273.62
  rectangle: -171.26,-352.36 -163.39,-273.62
  rectangle: -151.57,-352.36 -143.7,-273.62
  rectangle: -131.89,-352.36 -124.02,-273.62
  rectangle: -112.2,-352.36 -104.33,-273.62
  rectangle: -92.52,-352.36 -84.65,-273.62
  rectangle: -72.83,-352.36 -64.96,-273.62
  rectangle: -53.15,-352.36 -45.28,-273.62
  rectangle: -33.46,-352.36 -25.59,-273.62
  rectangle: -13.78,-352.36 -5.91,-273.62
  rectangle: 5.91,-352.36 13.78,-273.62
  rectangle: 25.59,-352.36 33.46,-273.62
  rectangle: 45.28,-352.36 53.15,-273.62
  rectangle: 64.96,-352.36 72.83,-273.62
  rectangle: 84.65,-352.36 92.52,-273.62
  rectangle: 104.33,-352.36 112.2,-273.62
  rectangle: 124.02,-352.36 131.89,-273.62
  rectangle: 143.7,-352.36 151.57,-273.62
  rectangle: 163.39,-352.36 171.26,-273.62
  rectangle: 183.07,-352.36 190.94,-273.62
  rectangle: 202.76,-352.36 210.63,-273.62
  rectangle: 222.44,-352.36 230.32,-273.62
  rectangle: 242.13,-352.36 250,-273.62
  rectangle: 261.81,-352.36 269.69,-273.62
  rectangle: 281.5,-352.36 289.37,-273.62
  rectangle: 301.18,-352.36 309.06,-273.62
  rectangle: 320.87,-352.36 328.74,-273.62
  rectangle: 340.55,-352.36 348.43,-273.62
  rectangle: 360.24,-352.36 368.11,-273.62
  rectangle: 391.73,-250 470.47,-242.13
  rectangle: 391.73,-230.32 470.47,-222.44
  rectangle: 391.73,-210.63 470.47,-202.76
  rectangle: 391.73,-190.94 470.47,-183.07
  rectangle: 391.73,-171.26 470.47,-163.39
  rectangle: 391.73,-151.57 470.47,-143.7
  rectangle: 391.73,-131.89 470.47,-124.02
  rectangle: 391.73,-112.2 470.47,-104.33
  rectangle: 391.73,-92.52 470.47,-84.65
  rectangle: 391.73,-72.83 470.47,-64.96
  rectangle: 391.73,-53.15 470.47,-45.28
  rectangle: 391.73,-33.46 470.47,-25.59
  rectangle: 391.73,-13.78 470.47,-5.91
  rectangle: 391.73,5.91 470.47,13.78
  rectangle: 391.73,25.59 470.47,33.46
  rectangle: 391.73,45.28 470.47,53.15
  rectangle: 391.73,64.96 470.47,72.83
  rectangle: 391.73,84.65 470.47,92.52
  rectangle: 391.73,104.33 470.47,112.2
  rectangle: 391.73,124.02 470.47,131.89
  rectangle: 391.73,143.7 470.47,151.57
  rectangle: 391.73,163.39 470.47,171.26
  rectangle: 391.73,183.07 470.47,190.94
  rectangle: 391.73,202.76 470.47,210.63
  rectangle: 391.73,222.44 470.47,230.32
  rectangle: 391.73,242.13 470.47,250
  rectangle: 360.24,273.62 368.11,352.36
  rectangle: 340.55,273.62 348.43,352.36
  rectangle: 320.87,273.62 328.74,352.36
  rectangle: 301.18,273.62 309.06,352.36
  rectangle: 281.5,273.62 289.37,352.36
  rectangle: 261.81,273.62 269.69,352.36
  rectangle: 242.13,273.62 250,352.36
  rectangle: 222.44,273.62 230.32,352.36
  rectangle: 202.76,273.62 210.63,352.36
  rectangle: 183.07,273.62 190.94,352.36
  rectangle: 163.39,273.62 171.26,352.36
  rectangle: 143.7,273.62 151.57,352.36
  rectangle: 124.02,273.62 131.89,352.36
  rectangle: 104.33,273.62 112.2,352.36
  rectangle: 84.65,273.62 92.52,352.36
  rectangle: 64.96,273.62 72.83,352.36
  rectangle: 45.28,273.62 53.15,352.36
  rectangle: 25.59,273.62 33.46,352.36
  rectangle: 5.91,273.62 13.78,352.36
  rectangle: -13.78,273.62 -5.91,352.36
  rectangle: -33.46,273.62 -25.59,352.36
  rectangle: -53.15,273.62 -45.28,352.36
  rectangle: -72.83,273.62 -64.96,352.36
  rectangle: -92.52,273.62 -84.65,352.36
  rectangle: -112.2,273.62 -104.33,352.36
  rectangle: -131.89,273.62 -124.02,352.36
  rectangle: -151.57,273.62 -143.7,352.36
  rectangle: -171.26,273.62 -163.39,352.36
  rectangle: -190.94,273.62 -183.07,352.36
  rectangle: -210.63,273.62 -202.76,352.36
  rectangle: -230.32,273.62 -222.44,352.36
  rectangle: -250,273.62 -242.13,352.36
  rectangle: -269.69,273.62 -261.81,352.36
  rectangle: -289.37,273.62 -281.5,352.36
  rectangle: -309.06,273.62 -301.18,352.36
  rectangle: -328.74,273.62 -320.87,352.36
  rectangle: -348.43,273.62 -340.55,352.36
  rectangle: -368.11,273.62 -360.24,352.36
  rectangle: -470.47,242.13 -391.73,250
  rectangle: -470.47,222.44 -391.73,230.32
  rectangle: -470.47,202.76 -391.73,210.63
  rectangle: -470.47,183.07 -391.73,190.94
  rectangle: -470.47,163.39 -391.73,171.26
  rectangle: -470.47,143.7 -391.73,151.57
  rectangle: -470.47,124.02 -391.73,131.89
  rectangle: -470.47,104.33 -391.73,112.2
  rectangle: -470.47,84.65 -391.73,92.52
  rectangle: -470.47,64.96 -391.73,72.83
  rectangle: -470.47,45.28 -391.73,53.15
  rectangle: -470.47,25.59 -391.73,33.46
  rectangle: -470.47,5.91 -391.73,13.78
  rectangle: -470.47,-13.78 -391.73,-5.91
  rectangle: -470.47,-33.46 -391.73,-25.59
  rectangle: -470.47,-53.15 -391.73,-45.28
  rectangle: -470.47,-72.83 -391.73,-64.96
  rectangle: -470.47,-92.52 -391.73,-84.65
  rectangle: -470.47,-112.2 -391.73,-104.33
  rectangle: -470.47,-131.89 -391.73,-124.02
  rectangle: -470.47,-151.57 -391.73,-143.7
  rectangle: -470.47,-171.26 -391.73,-163.39
  rectangle: -470.47,-190.94 -391.73,-183.07
  rectangle: -470.47,-210.63 -391.73,-202.76
  rectangle: -470.47,-230.32 -391.73,-222.44
  rectangle: -470.47,-250 -391.73,-242.13
  lines w8: -389.76,-271.65 389.76,-271.65 389.76,271.65 -389.76,271.65 -389.76,-271.65

## PQFP132 [mm]
pads (132):
  rect 0.35x1.8 smd: 1(-10.16,-13.2) 2(-9.525,-13.2) 3(-8.89,-13.2) 4(-8.255,-13.2) 5(-7.62,-13.2) 6(-6.985,-13.2) 7(-6.35,-13.2) 8(-5.715,-13.2) 9(-5.08,-13.2) 10(-4.445,-13.2) 11(-3.81,-13.2) 12(-3.175,-13.2) 13(-2.54,-13.2) 14(-1.905,-13.2) 15(-1.27,-13.2) 16(-0.635,-13.2) 17(0,-13.2) 18(0.635,-13.2) 19(1.27,-13.2) 20(1.905,-13.2) 21(2.54,-13.2) 22(3.175,-13.2) 23(3.81,-13.2) 24(4.445,-13.2) 25(5.08,-13.2) 26(5.715,-13.2) 27(6.35,-13.2) 28(6.985,-13.2) 29(7.62,-13.2) 30(8.255,-13.2) 31(8.89,-13.2) 32(9.525,-13.2) 33(10.16,-13.2) 67(10.16,13.2) 68(9.525,13.2) 69(8.89,13.2) 70(8.255,13.2) 71(7.62,13.2) 72(6.985,13.2) 73(6.35,13.2) 74(5.715,13.2) 75(5.08,13.2) 76(4.445,13.2) 77(3.81,13.2) 78(3.175,13.2) 79(2.54,13.2) 80(1.905,13.2) 81(1.27,13.2) 82(0.635,13.2) 83(0,13.2) 84(-0.635,13.2) 85(-1.27,13.2) 86(-1.905,13.2) 87(-2.54,13.2) 88(-3.175,13.2) 89(-3.81,13.2) 90(-4.445,13.2) 91(-5.08,13.2) 92(-5.715,13.2) 93(-6.35,13.2) 94(-6.985,13.2) 95(-7.62,13.2) 96(-8.255,13.2) 97(-8.89,13.2) 98(-9.525,13.2) 99(-10.16,13.2)
  rect 1.8x0.35 smd: 34(13.2,-10.16) 35(13.2,-9.525) 36(13.2,-8.89) 37(13.2,-8.255) 38(13.2,-7.62) 39(13.2,-6.985) 40(13.2,-6.35) 41(13.2,-5.715) 42(13.2,-5.08) 43(13.2,-4.445) 44(13.2,-3.81) 45(13.2,-3.175) 46(13.2,-2.54) 47(13.2,-1.905) 48(13.2,-1.27) 49(13.2,-0.635) 50(13.2,0) 51(13.2,0.635) 52(13.2,1.27) 53(13.2,1.905) 54(13.2,2.54) 55(13.2,3.175) 56(13.2,3.81) 57(13.2,4.445) 58(13.2,5.08) 59(13.2,5.715) 60(13.2,6.35) 61(13.2,6.985) 62(13.2,7.62) 63(13.2,8.255) 64(13.2,8.89) 65(13.2,9.525) 66(13.2,10.16) 100(-13.2,10.16) 101(-13.2,9.525) 102(-13.2,8.89) 103(-13.2,8.255) 104(-13.2,7.62) 105(-13.2,6.985) 106(-13.2,6.35) 107(-13.2,5.715) 108(-13.2,5.08) 109(-13.2,4.445) 110(-13.2,3.81) 111(-13.2,3.175) 112(-13.2,2.54) 113(-13.2,1.905) 114(-13.2,1.27) 115(-13.2,0.635) 116(-13.2,0) 117(-13.2,-0.635) 118(-13.2,-1.27) 119(-13.2,-1.905) 120(-13.2,-2.54) 121(-13.2,-3.175) 122(-13.2,-3.81) 123(-13.2,-4.445) 124(-13.2,-5.08) 125(-13.2,-5.715) 126(-13.2,-6.35) 127(-13.2,-6.985) 128(-13.2,-7.62) 129(-13.2,-8.255) 130(-13.2,-8.89) 131(-13.2,-9.525) 132(-13.2,-10.16)
Top Overlay:
  lines w0.203: -13.76,12.152 -13.76,12.914 ; -13.746,12.152 -12.14,10.882 ; -13.746,12.914 -12.984,13.69 -12.222,13.69 ; -13.73,-12.182 -13.73,-12.944 -12.954,-13.706 ; -13.716,-12.182 -12.11,-10.912 ; -12.954,-13.72 -12.192,-13.72 ; -12.222,13.676 -10.952,12.07 ; -12.192,-13.706 -10.922,-12.1 -10.586,-12.1 ; -12.14,-10.962 -12.14,10.8 ; -10.962,12.14 10.8,12.14 ; 10.795,-12.055 10.795,-11.42 -10.586,-11.42 -10.586,-12.1 ; 10.882,12.14 12.152,13.746 ; 10.922,-12.1 -10.586,-12.1 ; 10.952,-12.07 12.222,-13.676 ; 12.07,10.952 13.676,12.222 ; 12.14,-10.882 13.746,-12.152 ; 12.14,-10.8 12.14,10.962 ; 12.152,13.76 12.914,13.76 ; 12.222,-13.69 12.984,-13.69 13.746,-12.914 ; 12.914,13.746 13.69,12.984 13.69,12.222 ; 13.76,-12.914 13.76,-12.152
  text "1" at -10.42,-11.33 h1.97
Mechanical 16:
  drawing of 264 lines, arcs and shapes, not listed
Mechanical 27:
  lines w0.2: -14.4,-14.4 -14.4,14.4 14.4,14.4 14.4,-14.4 -14.4,-14.4